# Altium footprint library hphonglib.PcbLib: 703 footprints (part 15 of 44)
Each footprint in its own frame and in the unit in brackets; x right, y up, seen from the top. Pads: shape width x height; smd on the part's side, far side on the other; paste and mask are expansions set on the pad; w line width, h text height; cw(c..) or ccw(c..) is an arc to the next point about the centre after c.
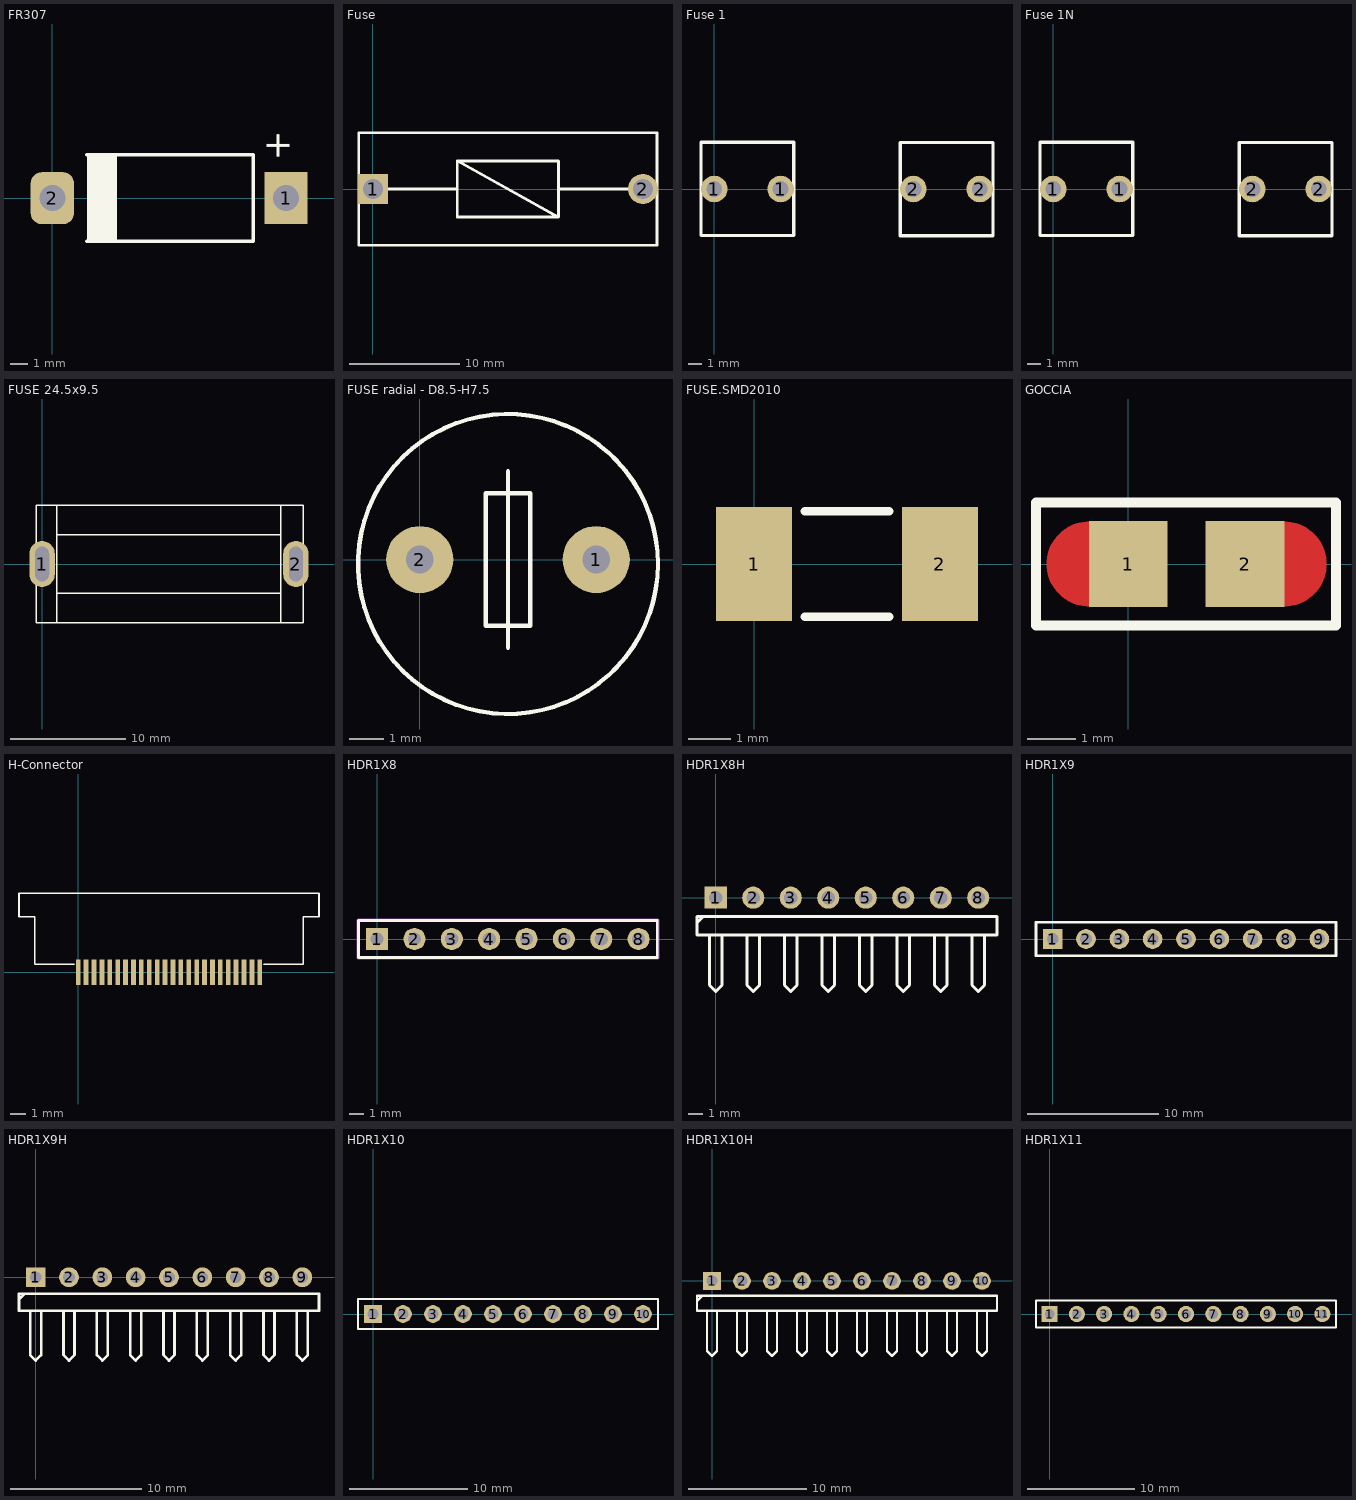
[diagram p14: the footprints below, top view; thin cyan lines are the x and y axes]

## FR307 [mm]
height 2.8
pads (2):
  rect 2.5x3 hole 1.5: 1(13.5,0)
  rrect50% 2.5x3 hole 1.5: 2(0,0)
Top Overlay:
  rectangle: 1.995,-2.525 3.74,2.5
  lines w0.2: 1.995,-2.5 11.595,-2.5 ; 1.995,2.5 11.595,2.5 11.595,-2.475
  text "+" at 13.716,2.159 h1.52
Bottom Overlay:
  lines w0.254: -1.925,-2.625 -1.925,2.6 -1.575,2.6 15.4,2.6 15.4,-2.625 -1.925,-2.625
3D body: height 5.65, standoff -3, extent -1.368,-2.692 14.932,2.608

## Fuse [mil] "Fuse Box; 2 Leads; Solder Pad 35mil"
pads (2):
  rect 107x107 hole 72: 1(0.67,0)
  round 107 hole 72: 2(960,0)
Top Overlay:
  lines w10: 0,0 300,0 ; 660,0 960,0 ; 300,100 660,-100 ; 300,100 660,100 660,-100 ; 300,100 300,-100 660,-100 ; -50,-200 1010,-200 1010,200 -50,200 -50,-200
3D body: height 81.43, standoff -430.39, extent -12.12,-177.33 972.12,177

## Fuse 1 [mm]
pads (4):
  round 2 hole 1.2: 1(0,0) 1(5,0) 2(15,0) 2(20,0)
Top Overlay:
  lines w0.254: -1,-3.5 6,-3.5 6,3.525 -1,3.525 -1,-3.5 ; 14,-3.525 14,3.5 21,3.5 21,-3.525 14,-3.525
Bottom Overlay:
  lines w0.254: -1.3,-3.525 -1.3,3.475 -1,3.475 21.3,3.475 21.3,-3.525 -1.3,-3.525
3D body: height 6.98, standoff 3, extent 5.775,-2 14.275,1.992
3D body: height 6.98, standoff 3, extent 14.25,-1.992 19.25,2
3D body: height 6.98, standoff 3, extent 0.775,-2 5.775,1.992
3D body: height 8, standoff 0.1, extent 15,2.25 20,2.525
3D body: height 8, standoff 0.1, extent 15,-2.55 20,-2.25
3D body: height 8, standoff 0.1, extent 0,-2.575 5,-2.25
3D body: height 8, standoff 0.1, extent 0,2.25 5,2.575
3D body: height 1, standoff 0.1, extent -0.025,-2.25 4.975,2.25
3D body: height 1, standoff 0.1, extent 15.025,-2.25 20.025,2.25

## Fuse 1N [mm]
pads (4):
  round 2 hole 1.2: 1(0,0) 1(5,0) 2(15,0) 2(20,0)
Top Overlay:
  lines w0.254: -1,-3.5 6,-3.5 6,3.525 -1,3.525 -1,-3.5 ; 14,-3.525 14,3.5 21,3.5 21,-3.525 14,-3.525
Bottom Overlay:
  lines w0.254: -1.3,-3.525 -1.3,3.475 -1,3.475 21.3,3.475 21.3,-3.525 -1.3,-3.525
3D body: height 9.6, standoff -3.3, extent -0.66,-3.099 5.436,3.091
3D body: height 9.6, standoff -3.3, extent 14.503,-3.15 20.599,3.041
3D body: height 6.98, standoff 3, extent 5.775,-2.025 14.275,1.967
3D body: height 6.98, standoff 3, extent 14.25,-2.018 19.25,1.975
3D body: height 6.98, standoff 3, extent 0.775,-2.025 5.775,1.967

## FUSE 24.5x9.5 [mm]
pads (2):
  oval 2.2x4 hole 1.2 slot 3 at 90 deg unplated: 1(0,0) 2(22,0)
Top Overlay:
  lines w0.127: 1.27,-2.54 20.625,-2.54 ; 1.27,2.54 20.65,2.54 ; 1.27,-5.08 20.69,-5.08 ; 1.27,-5.08 1.27,5.08 ; 1.27,-5.08 -0.508,-5.08 -0.508,5.08 1.27,5.08 ; 1.27,5.08 20.69,5.08 ; 20.69,-5.08 20.69,5.08 ; 20.69,-5.08 22.625,-5.08 22.625,5.08 20.69,5.08
  lines w1: 0,-0.975 0,1.025 ; 22,-1 22,1
3D body: height 6.98, standoff 3, extent 1.664,-2.025 6.664,1.967
3D body: height 6.98, standoff 3, extent 15.139,-2.018 20.139,1.975
3D body: height 6.98, standoff 3, extent 6.664,-2.025 15.164,1.967
3D body: height 11.5, standoff -1.87, extent -1.278,-4.597 23.122,4.803

## FUSE radial - D8.5-H7.5 [mil]
pads (2):
  round 76 hole 31.49 unplated: 1(200,0) 2(0,0)
Top Overlay:
  circle w5: c100,-5 r170
  lines w5: 100,-100 100,100 ; 75,-75 75,75 125,75 125,-75 75,-75

## FUSE.SMD2010 [mm] "2010 Body 5.0 x 2.5 mm (LxW typ)"
height 0.6
pads (2):
  rect 1.8x2.7 smd: 1(0,0) 2(4.4,0)
Top Overlay:
  lines w0.2: 1.2,-1.25 3.2,-1.25 ; 1.2,1.25 3.2,1.25

## GOCCIA [mil] "Goccia a stagno"
height 5
pads (2):
  rect 64x70 smd: 1(0,0) 2(95,0)
Top Layer:
  lines w35: -32,-17 cw(c-32,0) -32,17 ; 127,-17 ccw(c127,0) 127,17
Top Overlay:
  lines w8: -75,-50 169,-50 169,50 -75,50 -75,-50
Top Paste:
  lines w35: -32,-17 cw(c-32,0) -32,17 ; 127,-17 ccw(c127,0) 127,17
Top Solder:
  lines w39: -36,-19 cw(c-36,0) -36,19 ; 130,-19 ccw(c130,0) 130,19

## H-Connector [mm]
pads (24):
  rect 0.3x1.6 smd: 1(0,0) 2(0.5,0) 3(1,0) 4(1.5,0) 5(2,0) 6(2.5,0) 7(3,0) 8(3.5,0) 9(4,0) 10(4.5,0) 11(5,0) 12(5.5,0) 13(6,0) 14(6.5,0) 15(7,0) 16(7.5,0) 17(8,0) 18(8.5,0) 19(9,0) 20(9.5,0) 21(10,0) 22(10.5,0) 23(11,0) 24(11.5,0)
Top Overlay:
  lines w0.1: -0.25,0.5 -2.75,0.5 -2.75,3.5 -3.75,3.5 -3.75,5 -0.975,5 15.25,5 15.25,3.5 14.25,3.5 14.25,0.5 11.75,0.5

## HDR1X8 [mm]
pads (8):
  rect 1.5x1.5 hole 0.9: 1(0,0)
  round 1.5 hole 0.9: 2(2.54,0) 3(5.08,0) 4(7.62,0) 5(10.16,0) 6(12.7,0) 7(15.24,0) 8(17.78,0)
Top Overlay:
  lines w0.2: -1.27,-1.27 -1.27,1.27 19.05,1.27 19.05,-1.27 -1.27,-1.27
  text "." at -1.422,-2.286 h1
Bottom Overlay:
  lines w0.1: -1.295,-1.321 -1.295,1.321 19.101,1.321 19.101,-1.321 -1.295,-1.321
  text "." at -1.422,-2.286 h1
Mechanical 13:
  lines w0.2: -1.3,-1.3 19.1,-1.3 19.1,1.3 -1.3,1.3 -1.3,-1.3
  text ".Designator" at 6.071,-0.483 h2.03
3D body: height 8.89, standoff -2.54, extent -0.254,-0.254 0.254,0.254
3D body: height 2.54, standoff 0.25, extent -1.27,-1.27 3.81,1.27
3D body: height 8.89, standoff -2.54, extent 2.286,-0.254 2.794,0.254
3D body: height 2.54, standoff 0.25, extent 1.27,-1.27 6.35,1.27
3D body: height 8.89, standoff -2.54, extent 4.826,-0.254 5.334,0.254
3D body: height 2.54, standoff 0.25, extent 3.81,-1.27 8.89,1.27
3D body: height 8.89, standoff -2.54, extent 9.906,-0.254 10.414,0.254
3D body: height 8.89, standoff -2.54, extent 7.366,-0.254 7.874,0.254
3D body: height 2.54, standoff 0.25, extent 6.35,-1.27 11.43,1.27
3D body: height 8.89, standoff -2.54, extent 9.906,-0.254 10.414,0.254
3D body: height 2.54, standoff 0.25, extent 8.89,-1.27 13.97,1.27
3D body: height 8.89, standoff -2.54, extent 12.446,-0.254 12.954,0.254
3D body: height 2.54, standoff 0.25, extent 11.43,-1.27 16.51,1.27
3D body: height 8.89, standoff -2.54, extent 17.526,-0.254 18.034,0.254
3D body: height 8.89, standoff -2.54, extent 14.986,-0.254 15.494,0.254
3D body: height 2.54, standoff 0.25, extent 13.97,-1.27 19.05,1.27

## HDR1X8H [mm]
pads (8):
  rect 1.5x1.5 hole 0.9: 1(0,0)
  round 1.5 hole 0.9: 2(2.54,0) 3(5.08,0) 4(7.62,0) 5(10.16,0) 6(12.7,0) 7(15.24,0) 8(17.78,0)
Top Overlay:
  lines w0.2: -1.27,-1.693 -0.847,-1.27 ; -0.423,-2.54 -0.423,-5.927 0,-6.35 0.423,-5.927 0.423,-2.54 ; 2.117,-2.54 2.117,-5.927 2.54,-6.35 2.963,-5.927 2.963,-2.54 ; 4.657,-2.54 4.657,-5.927 5.08,-6.35 5.503,-5.927 5.503,-2.54 ; 7.197,-2.54 7.197,-5.927 7.62,-6.35 8.043,-5.927 8.043,-2.54 ; 9.737,-2.54 9.737,-5.927 10.16,-6.35 10.583,-5.927 10.583,-2.54 ; 12.277,-2.54 12.277,-5.927 12.7,-6.35 13.123,-5.927 13.123,-2.54 ; 14.817,-2.54 14.817,-5.927 15.24,-6.35 15.663,-5.927 15.663,-2.54 ; 17.357,-2.54 17.357,-5.927 17.78,-6.35 18.203,-5.927 18.203,-2.54 ; -1.27,-2.54 19.05,-2.54 19.05,-1.27 -1.27,-1.27 -1.27,-2.54
Mechanical 13:
  text ".Designator" at 5.563,-0.737 h2.03

## HDR1X9 [mm]
pads (9):
  rect 1.5x1.5 hole 0.9: 1(0,0)
  round 1.5 hole 0.9: 2(2.54,0) 3(5.08,0) 4(7.62,0) 5(10.16,0) 6(12.7,0) 7(15.24,0) 8(17.78,0) 9(20.32,0)
Top Overlay:
  lines w0.2: -1.27,-1.27 -1.27,1.27 21.59,1.27 21.59,-1.27 -1.27,-1.27
Mechanical 13:
  text ".Designator" at 6.96,-0.61 h2.03
3D body: height 2.54, standoff 0.25, extent 16.51,-1.27 21.59,1.27
3D body: height 8.89, standoff -2.54, extent 20.066,-0.254 20.574,0.254
3D body: height 8.89, standoff -2.54, extent 17.526,-0.254 18.034,0.254
3D body: height 2.54, standoff 0.25, extent 13.97,-1.27 19.05,1.27
3D body: height 8.89, standoff -2.54, extent 14.986,-0.254 15.494,0.254
3D body: height 2.54, standoff 0.25, extent 11.43,-1.27 16.51,1.27
3D body: height 8.89, standoff -2.54, extent 12.446,-0.254 12.954,0.254
3D body: height 2.54, standoff 0.25, extent 8.89,-1.27 13.97,1.27
3D body: height 2.54, standoff 0.25, extent 6.35,-1.27 11.43,1.27
3D body: height 8.89, standoff -2.54, extent 7.366,-0.254 7.874,0.254
3D body: height 8.89, standoff -2.54, extent 9.906,-0.254 10.414,0.254
3D body: height 2.54, standoff 0.25, extent 3.81,-1.27 8.89,1.27
3D body: height 8.89, standoff -2.54, extent 4.826,-0.254 5.334,0.254
3D body: height 2.54, standoff 0.25, extent 1.27,-1.27 6.35,1.27
3D body: height 8.89, standoff -2.54, extent 2.286,-0.254 2.794,0.254
3D body: height 2.54, standoff 0.25, extent -1.27,-1.27 3.81,1.27
3D body: height 8.89, standoff -2.54, extent -0.254,-0.254 0.254,0.254

## HDR1X9H [mm]
pads (9):
  rect 1.5x1.5 hole 0.9: 1(0,0)
  round 1.5 hole 0.9: 2(2.54,0) 3(5.08,0) 4(7.62,0) 5(10.16,0) 6(12.7,0) 7(15.24,0) 8(17.78,0) 9(20.32,0)
Top Overlay:
  lines w0.2: -1.27,-1.693 -0.847,-1.27 ; -0.423,-2.54 -0.423,-5.927 0,-6.35 0.423,-5.927 0.423,-2.54 ; 2.117,-2.54 2.117,-5.927 2.54,-6.35 2.963,-5.927 2.963,-2.54 ; 4.657,-2.54 4.657,-5.927 5.08,-6.35 5.503,-5.927 5.503,-2.54 ; 7.197,-2.54 7.197,-5.927 7.62,-6.35 8.043,-5.927 8.043,-2.54 ; 9.737,-2.54 9.737,-5.927 10.16,-6.35 10.583,-5.927 10.583,-2.54 ; 12.277,-2.54 12.277,-5.927 12.7,-6.35 13.123,-5.927 13.123,-2.54 ; 14.817,-2.54 14.817,-5.927 15.24,-6.35 15.663,-5.927 15.663,-2.54 ; 17.357,-2.54 17.357,-5.927 17.78,-6.35 18.203,-5.927 18.203,-2.54 ; 19.897,-2.54 19.897,-5.927 20.32,-6.35 20.743,-5.927 20.743,-2.54 ; -1.27,-2.54 21.59,-2.54 21.59,-1.27 -1.27,-1.27 -1.27,-2.54
Mechanical 13:
  text ".Designator" at 7.722,-0.483 h2.03

## HDR1X10 [mm]
pads (10):
  rect 1.5x1.5 hole 0.9: 1(0,0)
  round 1.5 hole 0.9: 2(2.54,0) 3(5.08,0) 4(7.62,0) 5(10.16,0) 6(12.7,0) 7(15.24,0) 8(17.78,0) 9(20.32,0) 10(22.86,0)
Top Overlay:
  lines w0.2: -1.27,-1.27 24.13,-1.27 24.13,1.27 0.635,1.27 -1.27,1.27 -1.27,-1.27
Mechanical 13:
  text ".Designator" at 8.611,-0.356 h2.03
3D body: height 8.89, standoff -2.54, extent 20.066,-0.254 20.574,0.254
3D body: height 8.89, standoff -2.54, extent 22.606,-0.254 23.114,0.254
3D body: height 2.54, standoff 0.25, extent 19.05,-1.27 24.13,1.27
3D body: height 8.89, standoff -2.54, extent 17.526,-0.254 18.034,0.254
3D body: height 2.54, standoff 0.25, extent 16.51,-1.27 21.59,1.27
3D body: height 8.89, standoff -2.54, extent 14.986,-0.254 15.494,0.254
3D body: height 2.54, standoff 0.25, extent 13.97,-1.27 19.05,1.27
3D body: height 8.89, standoff -2.54, extent 12.446,-0.254 12.954,0.254
3D body: height 2.54, standoff 0.25, extent 11.43,-1.27 16.51,1.27
3D body: height 8.89, standoff -2.54, extent 9.906,-0.254 10.414,0.254
3D body: height 2.54, standoff 0.25, extent 8.89,-1.27 13.97,1.27
3D body: height 8.89, standoff -2.54, extent 7.366,-0.254 7.874,0.254
3D body: height 2.54, standoff 0.25, extent 6.35,-1.27 11.43,1.27
3D body: height 8.89, standoff -2.54, extent 4.826,-0.254 5.334,0.254
3D body: height 2.54, standoff 0.25, extent 3.81,-1.27 8.89,1.27
3D body: height 8.89, standoff -2.54, extent 2.286,-0.254 2.794,0.254
3D body: height 2.54, standoff 0.25, extent 1.27,-1.27 6.35,1.27
3D body: height 2.54, standoff 0.25, extent -1.27,-1.27 3.81,1.27
3D body: height 8.89, standoff -2.54, extent -0.254,-0.254 0.254,0.254

## HDR1X10H [mm]
pads (10):
  rect 1.5x1.5 hole 0.9: 1(0,0)
  round 1.5 hole 0.9: 2(2.54,0) 3(5.08,0) 4(7.62,0) 5(10.16,0) 6(12.7,0) 7(15.24,0) 8(17.78,0) 9(20.32,0) 10(22.86,0)
Top Overlay:
  lines w0.2: -1.27,-1.693 -0.847,-1.27 ; -0.423,-2.54 -0.423,-5.927 0,-6.35 0.423,-5.927 0.423,-2.54 ; 2.117,-2.54 2.117,-5.927 2.54,-6.35 2.963,-5.927 2.963,-2.54 ; 4.657,-2.54 4.657,-5.927 5.08,-6.35 5.503,-5.927 5.503,-2.54 ; 7.197,-2.54 7.197,-5.927 7.62,-6.35 8.043,-5.927 8.043,-2.54 ; 9.737,-2.54 9.737,-5.927 10.16,-6.35 10.583,-5.927 10.583,-2.54 ; 12.277,-2.54 12.277,-5.927 12.7,-6.35 13.123,-5.927 13.123,-2.54 ; 14.817,-2.54 14.817,-5.927 15.24,-6.35 15.663,-5.927 15.663,-2.54 ; 17.357,-2.54 17.357,-5.927 17.78,-6.35 18.203,-5.927 18.203,-2.54 ; 19.897,-2.54 19.897,-5.927 20.32,-6.35 20.743,-5.927 20.743,-2.54 ; 22.437,-2.54 22.437,-5.927 22.86,-6.35 23.283,-5.927 23.283,-2.54 ; -1.27,-2.54 24.13,-2.54 24.13,-1.27 0.635,-1.27 -1.27,-1.27 -1.27,-2.54
Mechanical 13:
  text ".Designator" at 7.976,-0.483 h2.03

## HDR1X11 [mm]
pads (11):
  rect 1.5x1.5 hole 0.9: 1(0,0)
  round 1.5 hole 0.9: 2(2.54,0) 3(5.08,0) 4(7.62,0) 5(10.16,0) 6(12.7,0) 7(15.24,0) 8(17.78,0) 9(20.32,0) 10(22.86,0) 11(25.4,0)
Top Overlay:
  lines w0.2: -1.27,-1.27 -1.27,1.27 0.635,1.27 26.67,1.27 26.67,-1.27 -1.27,-1.27
Mechanical 13:
  text ".Designator" at 9.5,-0.483 h2.03